# Altium footprint library 20210518.PcbLib: 414 footprints (part 16 of 26)
Each footprint in its own frame and in the unit in brackets; x right, y up, seen from the top. Pads: shape width x height; smd on the part's side, far side on the other; paste and mask are expansions set on the pad; w line width, h text height; cw(c..) or ccw(c..) is an arc to the next point about the centre after c.
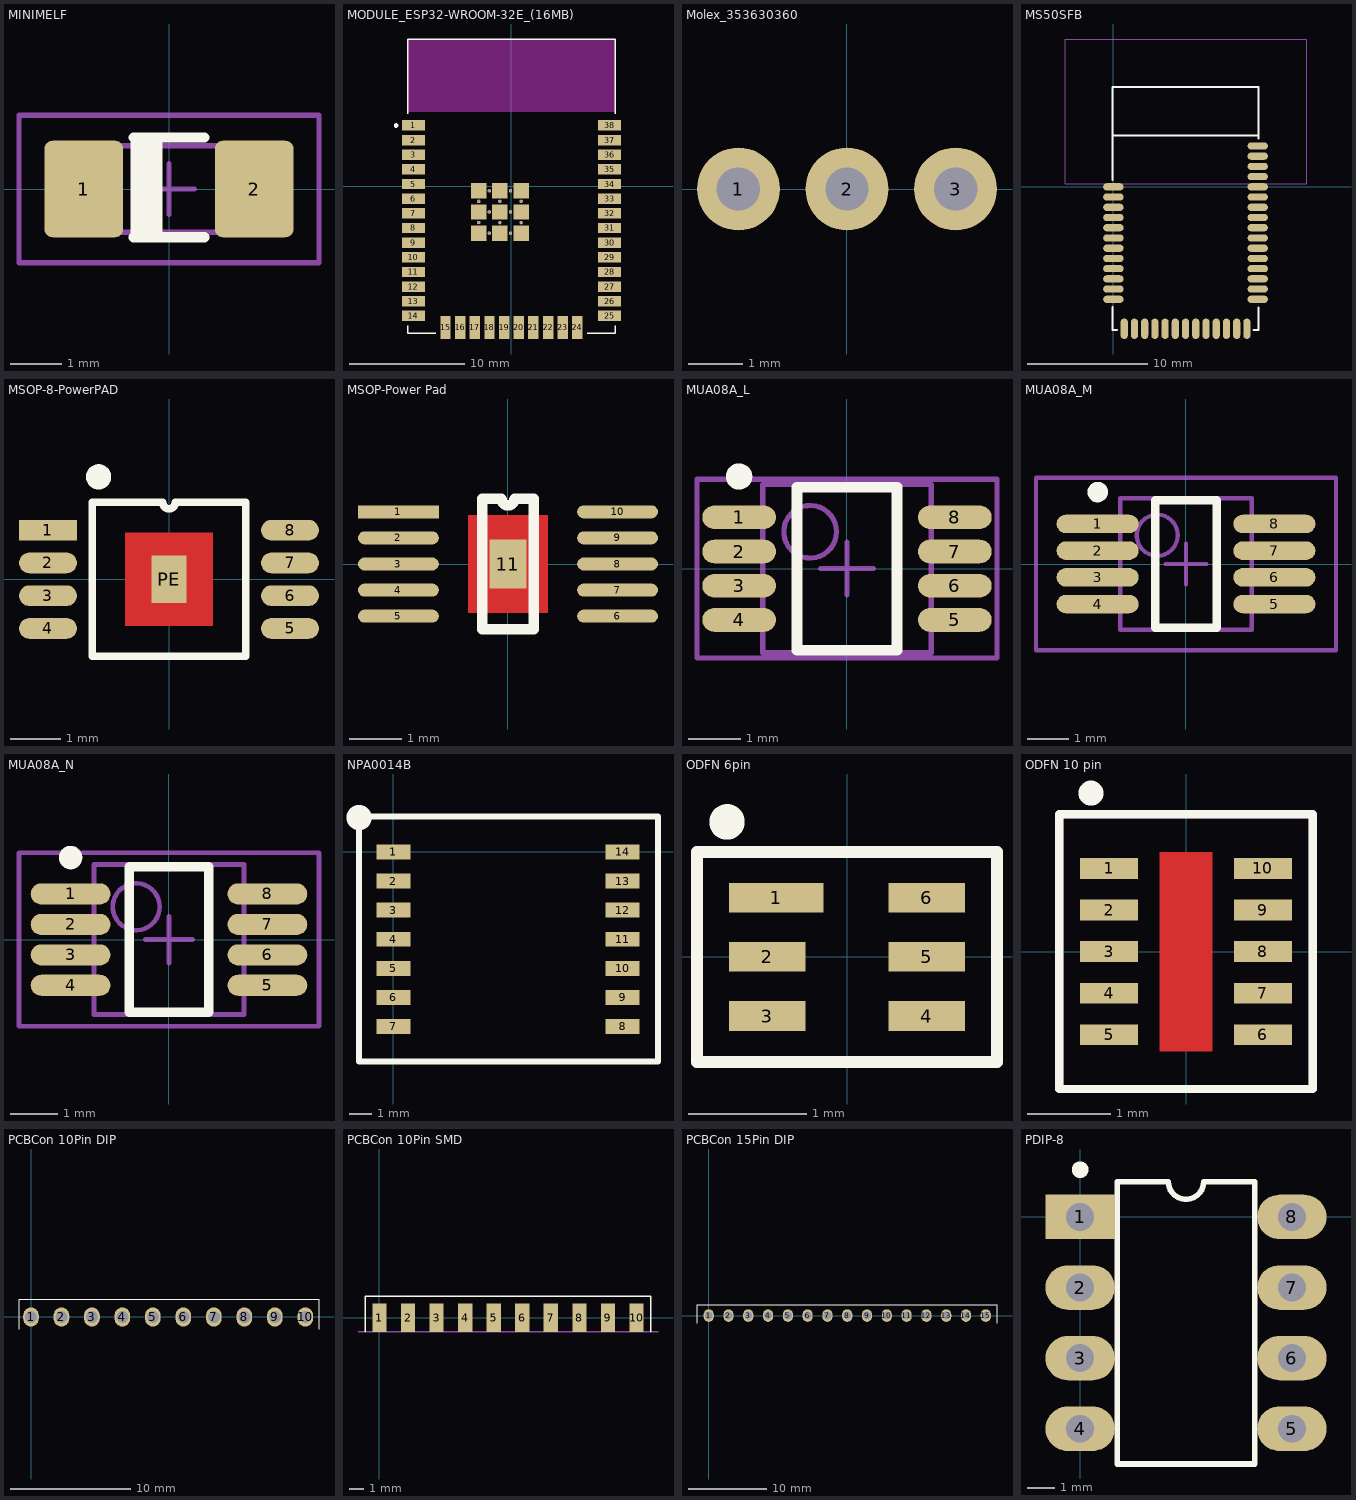
[diagram p15: the footprints below, top view; thin cyan lines are the x and y axes]

## MINIMELF [mm] "MELF Diode, 2-Leads, Body 3,5x1,5mm, IPC Low Density"
height 1.7
pads (2):
  rrect20% 1.55x1.9 smd: 1(-1.675,0) 2(1.675,0)
Top Overlay:
  rectangle: -0.762,-0.95 -0.127,0.95
  lines w0.2: -0.7,-0.95 0.7,-0.95 ; -0.7,1.016 0.7,1.016 ; -0.55,-0.95 -0.55,1.016
Mechanical 13:
  rectangle: -1.85,-0.85 -1.352,0.85
  lines w0.1: -1.85,-0.85 1.85,-0.85 1.85,0.85 -1.85,0.85 -1.85,-0.85
Mechanical 15:
  lines w0.1: -0.5,0 0.5,0 ; 0,-0.5 0,0.5 ; -2.95,-1.45 2.95,-1.45 2.95,1.45 -2.95,1.45 -2.95,-1.45
3D body: height 1.4, standoff 0, extent -1.75,-0.7 1.75,0.7

## MODULE_ESP32-WROOM-32E_(16MB) [mm]
pads (59):
  rect 2x0.9 smd: 1(-8.5,5.26) 2(-8.5,3.99) 3(-8.5,2.72) 4(-8.5,1.45) 5(-8.5,0.18) 6(-8.5,-1.09) 7(-8.5,-2.36) 8(-8.5,-3.63) 9(-8.5,-4.9) 10(-8.5,-6.17) 11(-8.5,-7.44) 12(-8.5,-8.71) 13(-8.5,-9.98) 14(-8.5,-11.25) 25(8.5,-11.25) 26(8.5,-9.98) 27(8.5,-8.71) 28(8.5,-7.44) 29(8.5,-6.17) 30(8.5,-4.9) 31(8.5,-3.63) 32(8.5,-2.36) 33(8.5,-1.09) 34(8.5,0.18) 35(8.5,1.45) 36(8.5,2.72) 37(8.5,3.99) 38(8.5,5.26)
  rect 0.9x2 smd: 15(-5.715,-12.25) 16(-4.445,-12.25) 17(-3.175,-12.25) 18(-1.905,-12.25) 19(-0.635,-12.25) 20(0.635,-12.25) 21(1.905,-12.25) 22(3.175,-12.25) 23(4.445,-12.25) 24(5.715,-12.25)
  rect 1.33x1.33 smd: 39_1(-2.835,-0.405) 39_2(-1,-0.405) 39_3(0.835,-0.405) 39_4(-2.835,-2.24) 39_5(-1,-2.24) 39_6(0.835,-2.24) 39_7(-2.835,-4.075) 39_8(-1,-4.075) 39_9(0.835,-4.075)
  round 0.3 hole 0.2: 39_10(-1.917,-0.405) 39_11(-0.082,-0.405) 39_12(-2.835,-1.322) 39_13(-1,-1.322) 39_14(0.835,-1.322) 39_15(-1.917,-2.24) 39_16(-0.082,-2.24) 39_17(-2.835,-3.157) 39_18(-1,-3.157) 39_19(0.835,-3.157) 39_20(-1.917,-4.075) 39_21(-0.082,-4.075)
Top Overlay:
  circle w0.2: c-10,5.25 r0.1
  lines w0.127: -9,-12.1 -9,-12.75 -6.55,-12.75 ; -9,6.25 -9,12.75 9,12.75 9,6.25 ; 6.55,-12.75 9,-12.75 9,-12.1
Keep-Out Layer:
  region: 9,6.45 -9,6.45 -9,12.75 9,12.75
  region: 9,6.45 -9,6.45 -9,12.75 9,12.75
Dimensions:
  text "ANTENNA" at -6,9 h1.78
3D body: height 2.91, standoff -0.01, extent -9,-12.75 9,12.75

## Molex_353630360 [mil] "2.00mm Pitch Sherlock Wire-to-Board Header, Right-Angle, with Positive Lock, 3 Circuits"
pads (3):
  round 60 hole 31.5: 1(-78.74,0) 2(0,0) 3(78.74,0)
3D body: height 218.5, standoff -124.02, extent -190.95,-78.75 190.94,334.64

## MS50SFB [mm] "Respect stay away lines if not model 3"
pads (41):
  oval 1.7x0.6 smd mask+0.06: 1(0,0) 2(0,-0.85) 3(0,-1.7) 4(0,-2.55) 5(0,-3.4) 6(0,-4.25) 7(0,-5.1) 8(0,-5.95) 9(0,-6.8) 10(0,-7.65) 11(0,-8.5) 12(0,-9.35) 26(12,-9.35) 27(12,-8.5) 28(12,-7.65) 29(12,-6.8) 30(12,-5.95) 31(12,-5.1) 32(12,-4.25) 33(12,-3.4) 34(12,-2.55) 35(12,-1.7) 36(12,-0.85) 37(12,0) 38(12,0.85) 39(12,1.701) 40(12,2.551) 41(12,3.401)
  oval 0.6x1.7 smd mask+0.06: 13(0.9,-11.8) 14(1.75,-11.8) 15(2.6,-11.8) 16(3.45,-11.8) 17(4.3,-11.8) 18(5.15,-11.8) 19(6,-11.8) 20(6.85,-11.8) 21(7.7,-11.8) 22(8.55,-11.8) 23(9.4,-11.8) 24(10.25,-11.8) 25(11.1,-11.8)
Top Overlay:
  lines w0.16: -0.075,-9.973 -0.075,-11.884 0.3,-11.884 ; -0.075,0.582 -0.075,8.291 12.075,8.291 12.075,4 ; -0.061,4.265 12.075,4.265 ; 11.643,-11.884 12.075,-11.884 12.075,-10.015
Dimensions:
  lines w0.1: -4,0.265 16.075,0.265 16.075,12.291 -4,12.291 -4,0.265
  text "STAY AWAY" at 2.31,5.81 h1.52
3D body: height 0.6, standoff 0, extent 0.025,-11.784 11.975,8.166
3D body: height 2, standoff 0.6, extent 0.9,-10.494 11.1,3.401

## MSOP-8-PowerPAD [mm] "TSOP, 8-Leads, Body 3x3mm, Pitch 0.65mm, IPC Low Density"
height 0.86
pads (9):
  rect 1.15x0.41 smd: 1(-2.4,0.975)
  oval 1.15x0.41 smd: 2(-2.4,0.325) 3(-2.4,-0.325) 4(-2.4,-0.975) 5(2.4,-0.975) 6(2.4,-0.325) 7(2.4,0.325) 8(2.4,0.975)
  rect 0.7x0.94 smd: PE(0,0)
Top Layer:
  rectangle: -0.875,-0.925 0.875,0.925
Top Overlay:
  circle w0.25: c-1.397,2.032 r0.125
  lines w0.15: -1.524,1.5 -1.524,-1.524 1.524,-1.524 1.524,1.524 0.125,1.524 cw(c0,1.524) -0.125,1.524 -1.524,1.524
3D body: height 0.86, standoff 0, extent -1.524,-1.5 1.476,1.5

## MSOP-Power Pad [mm]
pads (11):
  rect 1.55x0.25 smd: 1(-2.1,1)
  oval 1.55x0.25 smd: 2(-2.1,0.5) 3(-2.1,0) 4(-2.1,-0.5) 5(-2.1,-1) 6(2.1,-1) 7(2.1,-0.5) 8(2.1,0) 9(2.1,0.5) 10(2.1,1)
  rect 0.7x0.94 smd: 11(0,0)
Top Layer:
  rectangle: -0.77,-0.94 0.77,0.94
Top Overlay:
  lines w0.2: -0.49,-1.25 0.49,-1.25 0.49,1.25 0.125,1.25 cw(c0,1.25) -0.125,1.25 -0.49,1.25 -0.49,-1.25
3D body: height 1.15, standoff 0, extent -2.45,-1.5 2.45,1.5

## MUA08A_L [mm] "TSOP, 8-Leads, Body 3x3mm, Pitch 0.65mm, IPC High Density"
height 1.09
pads (8):
  oval 1.4x0.45 smd: 1(-2.05,0.975) 2(-2.05,0.325) 3(-2.05,-0.325) 4(-2.05,-0.975) 5(2.05,-0.975) 6(2.05,-0.325) 7(2.05,0.325) 8(2.05,0.975)
Top Overlay:
  circle w0.25: c-2.05,1.75 r0.125
  lines w0.2: -0.95,-1.55 -0.95,1.55 0.95,1.55 0.95,-1.55 -0.95,-1.55
Mechanical 13:
  circle w0.1: c-0.7,0.7 r0.5
  lines w0.1: -1.6,-1.6 -1.6,1.6 1.6,1.6 1.6,-1.6 -1.6,-1.6
Mechanical 15:
  lines w0.1: -0.5,0 0.5,0 ; 0,-0.5 0,0.5 ; -2.85,-1.7 -2.85,1.7 2.85,1.7 2.85,-1.7 -2.85,-1.7
3D body: height 1.09, standoff 0, extent -1.6,-1.6 1.6,1.6

## MUA08A_M [mm] "TSOP, 8-Leads, Body 3x3mm, Pitch 0.65mm, IPC Low Density"
height 1.09
pads (8):
  oval 2x0.45 smd: 1(-2.15,0.975) 2(-2.15,0.325) 3(-2.15,-0.325) 4(-2.15,-0.975) 5(2.15,-0.975) 6(2.15,-0.325) 7(2.15,0.325) 8(2.15,0.975)
Top Overlay:
  circle w0.25: c-2.15,1.75 r0.125
  lines w0.2: -0.75,-1.55 -0.75,1.55 0.75,1.55 0.75,-1.55 -0.75,-1.55
Mechanical 13:
  circle w0.1: c-0.7,0.7 r0.5
  lines w0.1: -1.6,-1.6 -1.6,1.6 1.6,1.6 1.6,-1.6 -1.6,-1.6
Mechanical 15:
  lines w0.1: -0.5,0 0.5,0 ; 0,-0.5 0,0.5 ; -3.65,-2.1 -3.65,2.1 3.65,2.1 3.65,-2.1 -3.65,-2.1
3D body: height 1.09, standoff 0, extent -1.6,-1.6 1.6,1.6

## MUA08A_N [mm] "TSOP, 8-Leads, Body 3x3mm, Pitch 0.65mm, IPC Medium Density"
height 1.09
pads (8):
  oval 1.7x0.45 smd: 1(-2.1,0.975) 2(-2.1,0.325) 3(-2.1,-0.325) 4(-2.1,-0.975) 5(2.1,-0.975) 6(2.1,-0.325) 7(2.1,0.325) 8(2.1,0.975)
Top Overlay:
  circle w0.25: c-2.1,1.75 r0.125
  lines w0.2: -0.85,-1.55 -0.85,1.55 0.85,1.55 0.85,-1.55 -0.85,-1.55
Mechanical 13:
  circle w0.1: c-0.7,0.7 r0.5
  lines w0.1: -1.6,-1.6 -1.6,1.6 1.6,1.6 1.6,-1.6 -1.6,-1.6
Mechanical 15:
  lines w0.1: -0.5,0 0.5,0 ; 0,-0.5 0,0.5 ; -3.2,-1.85 -3.2,1.85 3.2,1.85 3.2,-1.85 -3.2,-1.85
3D body: height 1.09, standoff 0, extent -1.6,-1.6 1.6,1.6

## NPA0014B [mm] "TI - LM2574 - SMD - NPA0014B"
height 2.65
pads (14):
  rect 1.5x0.65 smd: 1(0,0) 2(0,-1.27) 3(0,-2.54) 4(0,-3.81) 5(0,-5.08) 6(0,-6.35) 7(0,-7.62) 8(10,-7.62) 9(10,-6.35) 10(10,-5.08) 11(10,-3.81) 12(10,-2.54) 13(10,-1.27) 14(10,0)
Top Overlay:
  circle w1: c-1.5,1.5 r0.05
  lines w0.254: -1.5,-9.15 -1.5,1.55 11.55,1.55 11.55,-9.15 -1.5,-9.15
3D body: height 2.64, standoff 0, extent -0.162,-8.296 10.163,0.696

## ODFN 6pin [mm] "TSOP, 8-Leads, Body 3x3mm, Pitch 0.65mm, IPC High Density"
height 1.09
pads (6):
  rect 0.8x0.25 smd: 1(-0.6,0.5)
  rect 0.65x0.25 smd: 2(-0.675,0) 3(-0.675,-0.5) 4(0.675,-0.5) 5(0.675,0) 6(0.675,0.5)
Top Overlay:
  circle w0.25: c-1.016,1.143 r0.025
  lines w0.1: -1.27,-0.889 1.27,-0.889 1.27,0.889 -1.27,0.889 -1.27,-0.889
Mechanical 13:
  circle w0.1: c-1.016,1.143 r0.05
  lines w0.1: -1.27,-0.889 -1.27,0.889 1.27,0.889 1.27,-0.889 -1.27,-0.889
3D body: height 0.7, standoff 0, extent -0.762,-0.805 0.75,0.805

## ODFN 10 pin [mm] "TSOP, 8-Leads, Body 3x3mm, Pitch 0.65mm, IPC High Density"
height 1.09
pads (10):
  rect 0.7x0.25 smd: 1(-0.925,1) 2(-0.925,0.5) 3(-0.925,0) 4(-0.925,-0.5) 5(-0.925,-1) 6(0.925,-1) 7(0.925,-0.5) 8(0.925,0) 9(0.925,0.5) 10(0.925,1)
Top Layer:
  rectangle: -0.32,-1.2 0.32,1.2
Top Overlay:
  circle w0.25: c-1.143,1.905 r0.025
  lines w0.1: -1.524,-1.651 1.524,-1.651 1.524,1.651 -1.524,1.651 -1.524,-1.651
Mechanical 13:
  circle w0.1: c-1.143,1.905 r0.05
  lines w0.1: -1.524,-1.651 -1.524,1.651 1.524,1.651 1.524,-1.651 -1.524,-1.651
3D body: height 0.75, standoff 0, extent -1.013,-1.552 1.013,1.553

## PCBCon 10Pin DIP [mm] "10 pin PCB Connecion point 2.54mm*10"
pads (10):
  oval 1.3x1.6 hole 1: 1(0,0) 2(2.54,0) 3(5.08,0) 4(7.62,0) 5(10.16,0) 6(12.7,0) 7(15.24,0) 8(17.78,0) 9(20.32,0) 10(22.86,0)
Top Overlay:
  lines w0.1: -1,-1 -1,1.5 24,1.5 24,-1

## PCBCon 10Pin SMD [mm] "10 pin PCB Connecion point 2mm*10"
pads (10):
  rect 1x2 smd: 1(0,0) 2(2,0) 3(4,0) 4(6,0) 5(8,0) 6(10,0) 7(12,0) 8(14,0) 9(16,0) 10(18,0)
Top Overlay:
  lines w0.1: -1,-1 -1,1.5 19,1.5 19,-1
Mechanical 15:
  lines w0.1: -1.5,-1 19.5,-1

## PCBCon 15Pin DIP [mm] "15 pin PCB Connecion point 2.54mm*15"
pads (15):
  oval 1.3x1.6 hole 1: 1(0,0) 2(2.54,0) 3(5.08,0) 4(7.62,0) 5(10.16,0) 6(12.7,0) 7(15.24,0) 8(17.78,0) 9(20.32,0) 10(22.86,0) 11(25.4,0) 12(27.94,0) 13(30.48,0) 14(33.02,0) 15(35.56,0)
Top Overlay:
  lines w0.1: -1.5,-1 -1.5,1.4 37,1.4 37,-1
3D body: height 9.5, standoff -3.2, extent -1.27,-1.27 11.43,1.27
3D body: height 9.5, standoff -3.2, extent 11.43,-1.27 24.13,1.27
3D body: height 9.5, standoff -3.2, extent 24.13,-1.27 36.83,1.27

## PDIP-8 [mm]
pads (8):
  rect 2.5x1.6 hole 1: 1(0,0)
  oval 2.5x1.6 hole 1: 2(0,-2.54) 3(0,-5.08) 4(0,-7.62) 5(7.62,-7.62) 6(7.62,-5.08) 7(7.62,-2.54) 8(7.62,0)
Top Overlay:
  circle w0.4: c0,1.7 r0.1
  lines w0.2: 1.335,-8.89 6.285,-8.89 6.285,1.27 4.445,1.27 cw(c3.81,1.27) 3.175,1.27 1.335,1.27 1.335,-8.89